# Altium footprint library Connectors.PcbLib: 135 footprints (part 4 of 9)
Each footprint in its own frame and in the unit in brackets; x right, y up, seen from the top. Pads: shape width x height; smd on the part's side, far side on the other; paste and mask are expansions set on the pad; w line width, h text height; cw(c..) or ccw(c..) is an arc to the next point about the centre after c.
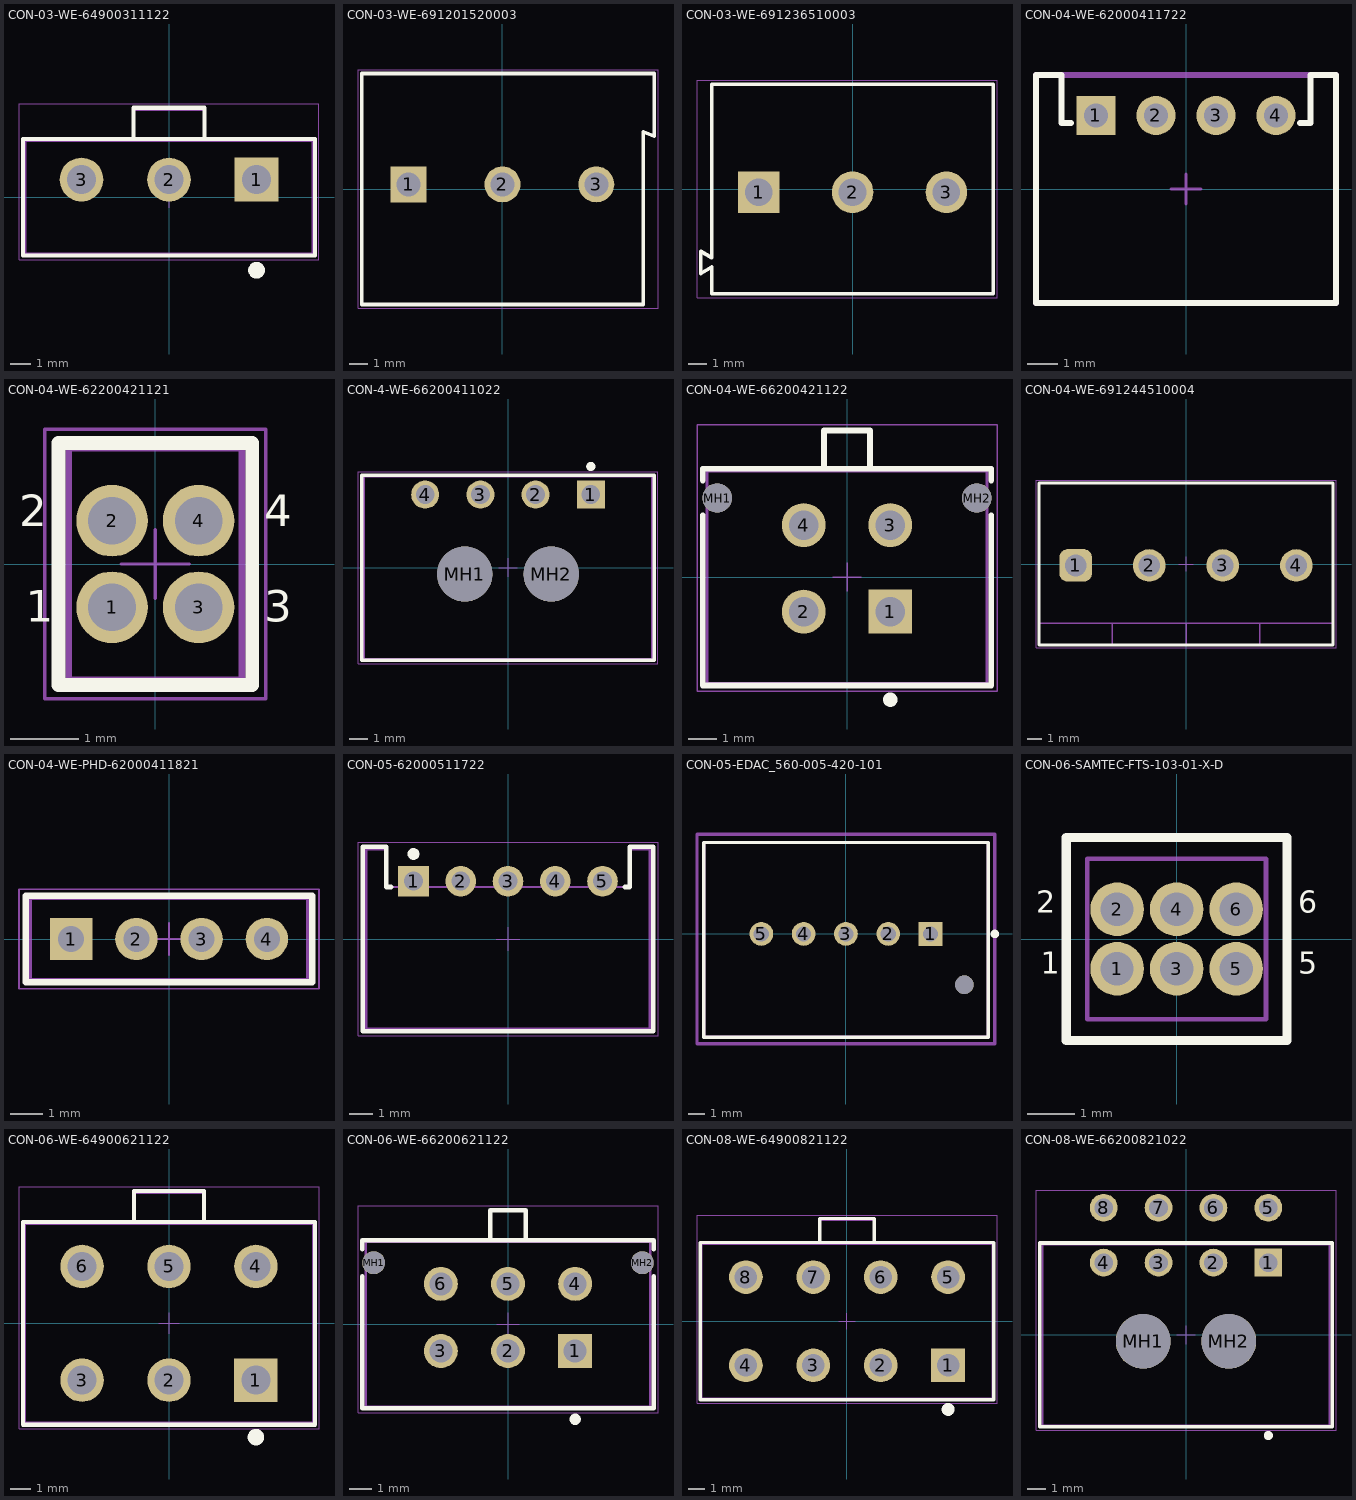
[diagram p3: the footprints below, top view; thin cyan lines are the x and y axes]

## CON-03-WE-64900311122 [mm] "4.20mm Male Single Row Vertical Header, 3p"
height 12.8
pads (3):
  rect 2.1x2.1 hole 1.4: 1(4.2,0.85)
  round 2.1 hole 1.4: 2(0,0.85) 3(-4.2,0.85)
Top Overlay:
  circle w0.4: c4.2,-3.5 r0.2
  lines w0.2: -1.7,2.8 -1.7,4.3 1.7,4.3 1.7,2.8 ; -7,-2.8 7,-2.8 7,2.8 -7,2.8 -7,-2.8
Top Component Center:
  lines w0.05: -0.5,0 0.5,0 ; 0,-0.5 0,0.5
Top Component Outline:
  lines w0.1: -1.7,2.7 -1.7,4.2 1.7,4.2 1.7,2.7 ; -6.9,-2.7 -6.9,2.7 6.9,2.7 6.9,-2.7 -6.9,-2.7
Top Courtyard (Mech26):
  lines w0.05: -7.2,-3 -7.2,4.5 7.2,4.5 7.2,-3 -7.2,-3
3D body "64900311122.stp": height 12.83, standoff -3.47, extent -6.9,-2.7 6.9,4.2

## CON-03-WE-691201520003 [mm] "Serie 2015 - 5.08 mm _ 3 pins"
height 12
pads (3):
  rect 1.95x1.95 hole 1.3: 1(-5.08,0.25)
  round 1.95 hole 1.3: 2(0,0.25) 3(5.08,0.25)
Top Overlay:
  lines w0.2: -7.62,-6.25 -7.62,6.25 8.22,6.25 8.22,2.85 7.62,3.1 7.62,-6.25 -7.62,-6.25
Top Component Center:
  lines w0.05: -0.5,0 0.5,0 ; 0,-0.5 0,0.5
Top Component Outline:
  lines w0.1: -7.62,-6.25 -7.62,6.25 8.22,6.25 8.22,2.85 7.62,3.1 7.62,-6.25 -7.62,-6.25
Top Courtyard (Mech26):
  lines w0.05: -7.82,-6.45 -7.82,6.45 8.42,6.45 8.42,-6.45 -7.82,-6.45
3D body "691201520003.stp": height 12.1, standoff -4.4, extent -7.62,-6.25 8.22,6.25

## CON-03-WE-691236510003 [mm] "Horizontal Cable Entry with Rising Cage Clamp, pitch 5.08mm, 03p"
height 18
pads (3):
  rect 2.25x2.25 hole 1.5: 1(-5.08,-0.175)
  round 2.25 hole 1.5: 2(0,-0.175) 3(5.08,-0.175)
Top Overlay:
  lines w0.2: -7.621,-4.223 -8.22,-4.575 -8.22,-3.375 -7.621,-3.727 ; -7.62,-4.225 -7.62,-5.675 7.62,-5.675 7.62,5.675 -7.62,5.675 -7.62,-3.726
Top Component Center:
  lines w0.05: -0.5,0 0.5,0 ; 0,-0.5 0,0.5
Top Component Outline:
  lines w0.1: -7.621,-4.223 -8.22,-4.575 -8.22,-3.375 -7.621,-3.727 ; -7.62,-4.225 -7.62,-5.675 7.62,-5.675 7.62,5.675 -7.62,5.675 -7.62,-3.726
Top Courtyard (Mech26):
  lines w0.05: -8.42,-5.875 -8.42,5.875 7.82,5.875 7.82,-5.875 -8.42,-5.875
3D body "691236510003.stp": height 18.1, standoff -3.9, extent -8.22,-5.675 7.62,5.675

## CON-04-WE-62000411722 [mm] "2.00mm Male Horizontal Shrouded Header, 4p"
height 4.5
pads (4):
  rect 1.3x1.3 hole 0.8: 1(-3,2.45)
  round 1.3 hole 0.8: 2(-1,2.45) 3(1,2.45) 4(3,2.45)
Top Overlay:
  lines w0.2: -3.84,2.2 -4.15,2.2 -4.15,3.8 -5,3.8 -5,-3.8 5,-3.8 5,3.8 4.15,3.8 4.15,2.2 3.8,2.2
Top Component Center:
  lines w0.1: -0.5,0 0.5,0 ; 0,-0.5 0,0.5
Top Component Outline:
  lines w0.2: -5,-3.8 -5,3.8 5,3.8 5,-3.8 -5,-3.8
3D body "62000411722.stp": height 4.85, standoff -3.24, extent -5,-3.8 5,3.8

## CON-04-WE-62200421121 [mm] "Pin Header, pitch 1.27 mm, THT, Vertical, dual row, 4p"
height 5.65
pads (4):
  round 1.05 hole 0.7: 1(-0.635,-0.635) 2(-0.635,0.635) 3(0.635,-0.635) 4(0.635,0.635)
Top Overlay:
  lines w0.2: -1.42,-1.775 -1.42,1.775 1.42,1.775 1.42,-1.775 -1.42,-1.775
  text "3" at 1.6,-1 h0.8
  text "4" at 1.6,0.4 h0.8
  text "1" at -1.9,-1 h0.8
  text "2" at -2,0.4 h0.8
Top Component Center:
  lines w0.05: -0.5,0 0.5,0 ; 0,-0.5 0,0.5
Top Component Outline:
  lines w0.1: -1.27,-1.7 1.27,-1.7 1.27,1.7 -1.27,1.7 -1.27,-1.7
Top Courtyard (Mech26):
  lines w0.05: -1.62,-1.975 1.62,-1.975 1.62,1.975 -1.62,1.975 -1.62,-1.975
3D body "62200421121.stp": height 5.33, standoff -2.27, extent -1.27,-1.7 1.27,1.7

## CON-4-WE-66200411022 [mm] "3.00mm Male Single Row Angled Header with Plastic Pegs, 4p"
height 5.07
pads (6):
  rect 1.52x1.52 hole 1.02: 1(4.5,3.97)
  round 1.52 hole 1.02: 2(1.5,3.97) 3(-1.5,3.97) 4(-4.5,3.97)
  round 3 hole 3 unplated: MH1(-2.35,-0.35) MH2(2.35,-0.35)
Top Overlay:
  circle w0.25: c4.5,5.5 r0.125
  lines w0.2: -7.95,-5.025 -7.95,5.025 7.95,5.025 7.95,-5.025 -7.95,-5.025
Top Component Center:
  lines w0.05: -0.5,0 0.5,0 ; 0,-0.5 0,0.5
Top Component Outline:
  lines w0.1: -7.825,-4.95 7.825,-4.95 7.825,4.95 -7.825,4.95 -7.825,-4.95
Top Courtyard (Mech26):
  lines w0.05: -8.15,-5.225 -8.15,5.225 8.15,5.225 8.15,-5.225 -8.15,-5.225
3D body "66200411022.stp": height 5.6, standoff -3.16, extent -7.825,-4.95 7.825,4.95

## CON-04-WE-66200421122 [mm] "Dual row Vertical header 04p"
height 9.9
pads (6):
  rect 1.52x1.52 hole 1.02: 1(1.5,-1.2)
  round 1.52 hole 1.02: 2(-1.5,-1.2) 3(1.5,1.8) 4(-1.5,1.8)
  round 1.02 hole 1.02 unplated: MH1(-4.5,2.74) MH2(4.5,2.74)
Top Overlay:
  circle w0.25: c1.5,-4.25 r0.125
  lines w0.2: -5,2.145 -5,-3.755 5,-3.755 5,2.145 ; -5,3.345 -5,3.755 5,3.755 5,3.345 ; -0.8,3.755 -0.8,5.08 0.8,5.08 0.8,3.755
Top Component Center:
  lines w0.05: -0.5,0 0.5,0 ; 0,-0.5 0,0.5
Top Component Outline:
  lines w0.1: -0.8,3.68 -0.8,5.08 0.8,5.08 0.8,3.68 ; -4.85,-3.68 -4.85,3.68 4.85,3.68 4.85,-3.68 -4.85,-3.68
Top Courtyard (Mech26):
  lines w0.05: -5.2,-3.955 -5.2,5.28 5.2,5.28 5.2,-3.955 -5.2,-3.955
3D body "66200421122.stp": height 9.93, standoff -3.17, extent -4.85,-3.68 4.85,5.08

## CON-04-WE-691244510004 [mm] "Serie 2445 - 5.08 mm _ 4 pins"
height 18
pads (4):
  rrect50% 2.25x2.25 hole 1.5: 1(-7.62,-0.1)
  round 2.25 hole 1.5: 2(-2.54,-0.1) 3(2.54,-0.1) 4(7.62,-0.1)
Top Overlay:
  lines w0.2: -10.16,-5.6 -10.16,5.6 10.16,5.6 10.16,-5.6 -10.16,-5.6
Top Component Center:
  lines w0.05: -0.5,0 0.5,0 ; 0,-0.5 0,0.5
Top Component Outline:
  lines w0.1: -10.16,-4.1 10.16,-4.1 ; -5.08,-5.6 -5.08,-4.1 ; 0,-5.6 0,-4.1 ; 5.08,-5.6 5.08,-4.1 ; -10.16,-5.6 10.16,-5.6 10.16,5.6 -10.16,5.6 -10.16,-5.6
Top Courtyard (Mech26):
  lines w0.05: -10.36,-5.8 10.36,-5.8 10.36,5.8 -10.36,5.8 -10.36,-5.8
Top Designator:
  text ".Designator" at -7.498,-0.5 h1.5
3D body "691244510004.stp": height 18.1, standoff -3.9, extent -10.16,-5.6 10.16,5.6

## CON-04-WE-PHD-62000411821 [mm] "Socket Header, Pitch 2.00 mm, THT, Vertical, single row, 4p"
height 4.45
pads (4):
  rect 1.3x1.3 hole 0.8: 1(-3,0)
  round 1.3 hole 0.8: 2(-1,0) 3(1,0) 4(3,0)
Top Overlay:
  lines w0.2: -4.4,-1.325 4.4,-1.325 4.4,1.325 -4.4,1.325 -4.4,-1.325
Top Component Center:
  lines w0.05: -0.5,0 0.5,0 ; 0,-0.5 0,0.5
Top Component Outline:
  lines w0.1: -4.25,-1.25 -4.25,1.25 4.25,1.25 4.25,-1.25 -4.25,-1.25
Top Courtyard (Mech26):
  lines w0.05: -4.6,-1.525 -4.6,1.525 4.6,1.525 4.6,-1.525 -4.6,-1.525
3D body "62000411821.stp": height 4.35, standoff -2.65, extent -4.25,-1.25 4.25,1.25

## CON-05-62000511722 [mm] "2.00mm Male Horizontal Shrouded Header, 5p"
height 4.5
pads (5):
  rect 1.3x1.3 hole 0.8: 1(-4,2.45)
  round 1.3 hole 0.8: 2(-2,2.45) 3(0,2.45) 4(2,2.45) 5(4,2.45)
Top Overlay:
  circle w0.25: c-4,3.6 r0.125
  lines w0.2: -4.95,2.2 -5.15,2.2 -5.15,3.9 -6.15,3.9 -6.15,-3.9 6.15,-3.9 6.15,3.9 5.15,3.9 5.15,2.2 4.95,2.2
Top Component Center:
  lines w0.05: -0.5,0 0.5,0 ; 0,-0.5 0,0.5
Top Component Outline:
  lines w0.1: -6,-3.8 6,-3.8 6,3.8 5.15,3.8 5.15,2.2 -5.15,2.2 -5.15,3.8 -6,3.8 -6,-3.8
Top Courtyard (Mech26):
  lines w0.05: -6.35,-4.1 -6.35,4.1 6.35,4.1 6.35,-4.1 -6.35,-4.1
3D body "62000511722.stp": height 4.83, standoff -3.27, extent -6,-3.8 6,3.8

## CON-05-EDAC_560-005-420-101 [mm] "EDAC 560 SERIES WATERPROOF CONNECTOR 5 Pin"
height 15.5
pads (6):
  rect 1.4x1.4 hole 0.9 paste-2539.97 mask+0: 1(5,0)
  round 1.4 hole 0.9 paste-2539.97 mask+0: 2(2.5,0) 3(0,0) 4(-2.5,0) 5(-5,0)
  round 1.1 hole 1.1 unplated paste-2539.97 mask+0: ""(7,-3)
Top Overlay:
  circle w0.25: c8.8,0 r0.125
  lines w0.2: -8.4,-6.1 8.4,-6.1 8.4,5.4 -8.4,5.4 -8.4,-6.1
Top Component Center:
  lines w0.1: -0.5,0 0.5,0 ; 0,-0.5 0,0.5
Top Component Outline:
  lines w0.2: -8.4,-6.1 8.4,-6.1 8.4,5.4 -8.4,5.4 -8.4,-6.1
Top Courtyard (Mech26):
  lines w0.2: -8.8,-6.5 8.8,-6.5 8.8,5.9 -8.8,5.9 -8.8,-6.5
3D body "560-005-420-101 - EDAC E-SEAL Waterproof Connector.STEP": height 15.5, standoff -3.4, extent -8.4,-6.1 8.4,5.45

## CON-06-SAMTEC-FTS-103-01-X-D [mil]
pads (6):
  round 45 hole 27.95 mask+0: 1(-50,-25) 2(-50,25) 3(0,-25) 4(0,25) 5(50,-25) 6(50,25)
Top Overlay:
  lines w7.87: -92.72,-85.24 -92.72,85.24 92.72,85.24 92.72,-85.24 -92.72,-85.24
  text "1" at -114.17,-35.43 h31.5
  text "2" at -118.11,15.75 h31.5
  text "5" at 102.36,-35.43 h31.5
  text "6" at 102.36,15.75 h31.5
Top Solder:
  circle w0: c-50,-25 r24.49
  circle w0: c-50,25 r24.49
  circle w0: c0,-25 r24.49
  circle w0: c0,25 r24.49
  circle w0: c50,-25 r24.49
  circle w0: c50,25 r24.49
Bottom Solder:
  circle w0: c-50,-25 r24.49
  circle w0: c-50,25 r24.49
  circle w0: c0,-25 r24.49
  circle w0: c0,25 r24.49
  circle w0: c50,-25 r24.49
  circle w0: c50,25 r24.49
Top Component Outline:
  lines w3.94: -75,-67.48 -25,-67.48 25,-67.48 75,-67.48 75,67.48 25,67.48 -25,67.48 -75,67.48 -75,-67.48 ; -57.99,-32.99 -42.01,-32.99 -42.01,-17.01 -57.99,-17.01 -57.99,-32.99 ; -57.99,17.01 -42.01,17.01 -42.01,32.99 -57.99,32.99 -57.99,17.01 ; -7.99,-32.99 -7.99,-17.01 7.99,-17.01 7.99,-32.99 -7.99,-32.99 ; -7.99,17.01 7.99,17.01 7.99,32.99 -7.99,32.99 -7.99,17.01 ; 42.01,-32.99 57.99,-32.99 57.99,-17.01 42.01,-17.01 42.01,-32.99 ; 42.01,17.01 57.99,17.01 57.99,32.99 42.01,32.99 42.01,17.01
Top Courtyard (Mech26):
  lines w3.94: -92.72,-85.24 92.72,-85.24 92.72,85.24 -92.72,85.24 -92.72,-85.24
3D body "FTS-103-01-L-D.stp": height 154, standoff -90, extent -75,-67.5 75,67.5

## CON-06-WE-64900621122 [mm] "4.20mm Male Dual Row Vertical Header, 6p"
height 12.8
pads (6):
  rect 2.1x2.1 hole 1.4: 1(4.2,-2.75)
  round 2.1 hole 1.4: 2(0,-2.75) 3(-4.2,-2.75) 4(4.2,2.75) 5(0,2.75) 6(-4.2,2.75)
Top Overlay:
  circle w0.4: c4.2,-5.5 r0.2
  lines w0.2: -1.7,4.9 -1.7,6.4 1.7,6.4 1.7,4.9 ; -7.05,-4.9 7.05,-4.9 7.05,4.9 -7.05,4.9 -7.05,-4.9
Top Component Center:
  lines w0.05: -0.5,0 0.5,0 ; 0,-0.5 0,0.5
Top Component Outline:
  lines w0.1: -1.7,4.8 -1.7,6.3 1.7,6.3 1.7,4.8 ; -6.95,-4.8 -6.95,4.8 6.95,4.8 6.95,-4.8 -6.95,-4.8
Top Courtyard (Mech26):
  lines w0.05: -7.25,-5.1 -7.25,6.6 7.25,6.6 7.25,-5.1 -7.25,-5.1
3D body "64900621122.stp": height 12.82, standoff -3.48, extent -6.95,-4.8 7.25,6.3

## CON-06-WE-66200621122 [mm] "Dual row Vertical header 06p"
height 9.9
pads (8):
  rect 1.52x1.52 hole 1.02: 1(3,-1.2)
  round 1.52 hole 1.02: 2(0,-1.2) 3(-3,-1.2) 4(3,1.8) 5(0,1.8) 6(-3,1.8)
  round 1.02 hole 1.02 unplated: MH1(-6,2.74) MH2(6,2.74)
Top Overlay:
  circle w0.25: c3,-4.25 r0.125
  lines w0.2: -6.5,2.145 -6.5,-3.755 6.5,-3.755 6.5,2.145 ; -6.5,3.345 -6.5,3.755 6.5,3.755 6.5,3.345 ; -0.8,3.755 -0.8,5.08 0.8,5.08 0.8,3.755
Top Component Center:
  lines w0.05: -0.5,0 0.5,0 ; 0,-0.5 0,0.5
Top Component Outline:
  lines w0.1: -0.8,3.68 -0.8,5.08 0.8,5.08 0.8,3.68 ; -6.35,-3.68 6.35,-3.68 6.35,3.68 -6.35,3.68 -6.35,-3.68
Top Courtyard (Mech26):
  lines w0.05: -6.7,-3.955 -6.7,5.28 6.7,5.28 6.7,-3.955 -6.7,-3.955
3D body "66200621122.stp": height 9.93, standoff -3.17, extent -6.35,-3.68 6.35,5.08

## CON-08-WE-64900821122 [mm] "4.20mm Male Dual Row Vertical Header, 8p"
height 12.8
pads (8):
  rect 2.1x2.1 hole 1.4: 1(6.3,-2.75)
  round 2.1 hole 1.4: 2(2.1,-2.75) 3(-2.1,-2.75) 4(-6.3,-2.75) 5(6.3,2.75) 6(2.1,2.75) 7(-2.1,2.75) 8(-6.3,2.75)
Top Overlay:
  circle w0.4: c6.3,-5.5 r0.2
  lines w0.2: -1.7,4.9 -1.7,6.4 1.7,6.4 1.7,4.9 ; -9.15,-4.9 9.15,-4.9 9.15,4.9 -9.15,4.9 -9.15,-4.9
Top Component Center:
  lines w0.05: -0.5,0 0.5,0 ; 0,-0.5 0,0.5
Top Component Outline:
  lines w0.1: -1.7,4.8 -1.7,6.3 1.7,6.3 1.7,4.8 ; -9.05,-4.8 9.05,-4.8 9.05,4.8 -9.05,4.8 -9.05,-4.8
Top Courtyard (Mech26):
  lines w0.05: -9.35,-5.1 -9.35,6.6 9.35,6.6 9.35,-5.1 -9.35,-5.1
3D body "64900821122.stp": height 12.82, standoff -3.48, extent -9.05,-4.8 9.35,6.3

## CON-08-WE-66200821022 [mm] "Dual row Right angle header With plastic peg 08p"
height 8.76
pads (10):
  rect 1.52x1.52 hole 1.02: 1(4.5,3.95)
  round 1.52 hole 1.02: 2(1.5,3.95) 3(-1.5,3.95) 4(-4.5,3.95) 5(4.5,6.95) 6(1.5,6.95) 7(-1.5,6.95) 8(-4.5,6.95)
  round 3 hole 3 unplated: MH1(-2.34,-0.35) MH2(2.34,-0.35)
Top Overlay:
  circle w0.25: c4.5,-5.5 r0.125
  lines w0.2: -8,-5.025 -8,5.025 8,5.025 8,-5.025 -8,-5.025
Top Component Center:
  lines w0.05: -0.5,0 0.5,0 ; 0,-0.5 0,0.5
Top Component Outline:
  lines w0.1: -7.85,-4.95 7.85,-4.95 7.85,4.95 -7.85,4.95 -7.85,-4.95
Top Courtyard (Mech26):
  lines w0.05: -8.2,-5.225 -8.2,7.91 8.2,7.91 8.2,-5.225 -8.2,-5.225
3D body "62000821022.stp": height 8.79, standoff -3.17, extent -7.85,-4.95 7.85,7.27